# Altium footprint library CubeSat-Backplane.PcbLib: 54 footprints (part 4 of 4)
Each footprint in its own frame and in the unit in brackets; x right, y up, seen from the top. Pads: shape width x height; smd on the part's side, far side on the other; paste and mask are expansions set on the pad; w line width, h text height; cw(c..) or ccw(c..) is an arc to the next point about the centre after c.
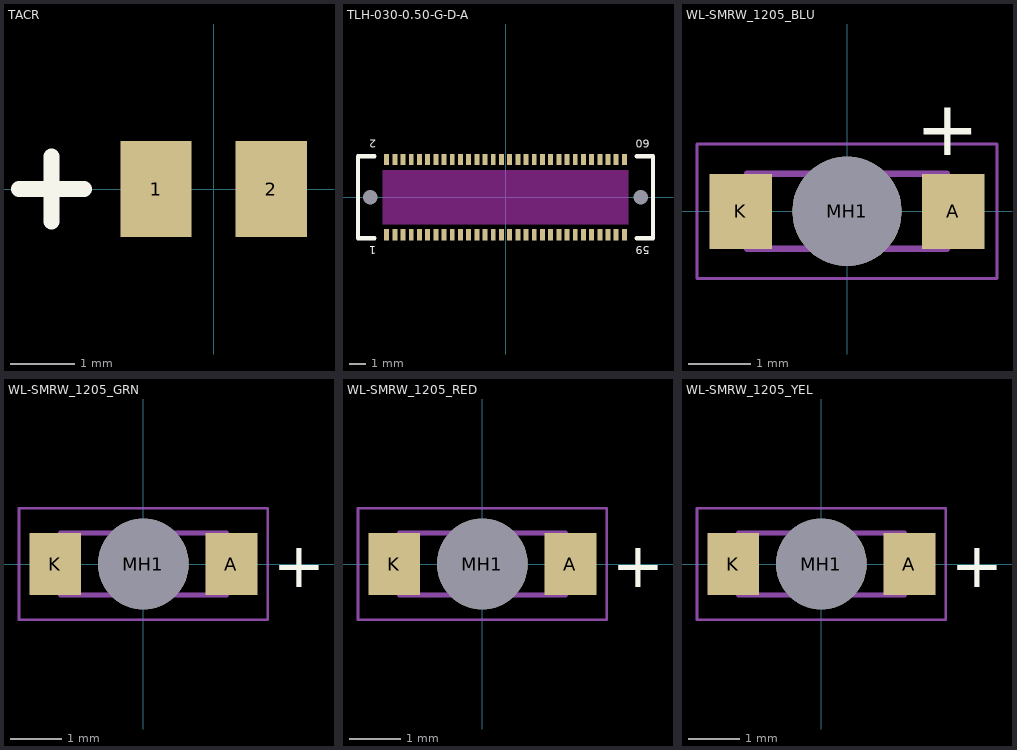
[diagram p3: the footprints below, top view; thin cyan lines are the x and y axes]

## TACR [mil]
pads (2):
  rect 44x59 smd paste+0 mask+0: 1(-35.5,0) 2(35.5,0)
Top Overlay:
  lines w10: -120,0 -80,0 ; -100,-20 -100,20
Bottom Courtyard:
  text "+ A C" at -99.98,-15 h30
3D body "TACR.step": height 59.02, standoff 0, extent -43.5,-29.48 43.51,29.49
3D body: height 10, standoff 0, extent 0,0 10,10

## TLH-030-0.50-G-D-A [mm] "Board to Board & Mezzanine Connectors 0.50 mm Razor Beam LP Ultra Low Profile Terminal Strip"
height 2
pads (62):
  rect 0.3x0.7 smd: 1(-7.25,-2.3) 2(-7.25,2.3) 3(-6.75,-2.3) 4(-6.75,2.3) 5(-6.25,-2.3) 6(-6.25,2.3) 7(-5.75,-2.3) 8(-5.75,2.3) 9(-5.25,-2.3) 10(-5.25,2.3) 11(-4.75,-2.3) 12(-4.75,2.3) 13(-4.25,-2.3) 14(-4.25,2.3) 15(-3.75,-2.3) 16(-3.75,2.3) 17(-3.25,-2.3) 18(-3.25,2.3) 19(-2.75,-2.3) 20(-2.75,2.3) 21(-2.25,-2.3) 22(-2.25,2.3) 23(-1.75,-2.3) 24(-1.75,2.3) 25(-1.25,-2.3) 26(-1.25,2.3) 27(-0.75,-2.3) 28(-0.75,2.3) 29(-0.25,-2.3) 30(-0.25,2.3) 31(0.25,-2.3) 32(0.25,2.3) 33(0.75,-2.3) 34(0.75,2.3) 35(1.25,-2.3) 36(1.25,2.3) 37(1.75,-2.3) 38(1.75,2.3) 39(2.25,-2.3) 40(2.25,2.3) 41(2.75,-2.3) 42(2.75,2.3) 43(3.25,-2.3) 44(3.25,2.3) 45(3.75,-2.3) 46(3.75,2.3) 47(4.25,-2.3) 48(4.25,2.3) 49(4.75,-2.3) 50(4.75,2.3) 51(5.25,-2.3) 52(5.25,2.3) 53(5.75,-2.3) 54(5.75,2.3) 55(6.25,-2.3) 56(6.25,2.3) 57(6.75,-2.3) 58(6.75,2.3) 59(7.25,-2.3) 60(7.25,2.3)
  round 0 hole 0.9 unplated: TH(-8.25,0) TH(8.25,0)
Top Layer keep-out:
  rectangle: -7.5,-1.651 7.5,1.651
Top Overlay:
  lines w0.254: -8,-2.5 -9,-2.5 -9,2.5 -8,2.5 ; 8,-2.5 9,-2.5 9,2.5 8,2.5
  text "1" at -7.9,-3 h0.5
  text "2" at -7.9,3.5 h0.5
  text "59" at 8.8,-3 h0.5
  text "60" at 8.8,3.5 h0.5
3D body "TLH-030-0.50-G-D-A.stp": height 1.82, standoff -0.54, extent -9,-2.5 9,2.5

## WL-SMRW_1205_BLU [mm] "SMD BLU Reverse mount Waterclear, body 3.2x1.2mm"
height 0.28
pads (3):
  rect 1x1.2 smd mask+0.08: A(1.7,0) K(-1.7,0)
  round 1.75 hole 1.75 unplated mask+0: MH1(0,0)
Top Overlay:
  text "+" at 1.1,0.9 h0.89
BOARD CHAMFER:
  region: 0.35,0.65 0.35,-0.65 0.05,-0.65 0.05,-0.15 -0.25,-0.15 -0.25,0.15 0.05,0.15 0.05,0.65
  lines w0.1: -1.6,-0.6 1.6,-0.6 1.6,0.6 -1.6,0.6 -1.6,-0.6
Mechanical 15:
  lines w0.05: -0.5,0 0.5,0 ; 0,-0.5 0,0.5 ; -2.4,-1.075 2.4,-1.075 2.4,1.075 -2.4,1.075 -2.4,-1.075
3D body "WE-SMRW_1205_rectangular.stp": height 0.28, standoff -0.82, extent -1.6,-0.6 1.6,0.6

## WL-SMRW_1205_GRN [mm] "SMD GRN Reverse mount Waterclear, body 3.2x1.2mm"
height 0.28
pads (3):
  rect 1x1.2 smd: A(1.7,0) K(-1.7,0)
  round 1.75 hole 1.75 unplated: MH1(0,0)
Top Overlay:
  text "+" at 2.5,-0.45 h0.89
BOARD CHAMFER:
  region: 0.35,0.65 0.35,-0.65 0.05,-0.65 0.05,-0.15 -0.25,-0.15 -0.25,0.15 0.05,0.15 0.05,0.65
  lines w0.1: -1.6,-0.6 1.6,-0.6 1.6,0.6 -1.6,0.6 -1.6,-0.6
Mechanical 15:
  lines w0.05: -0.5,0 0.5,0 ; 0,-0.5 0,0.5 ; -2.4,-1.075 2.4,-1.075 2.4,1.075 -2.4,1.075 -2.4,-1.075
3D body "WE-SMRW_1205_rectangular.stp": height 0.28, standoff -0.82, extent -1.6,-0.6 1.6,0.6

## WL-SMRW_1205_RED [mm] "SMD GRN Reverse mount Waterclear, body 3.2x1.2mm"
height 0.28
pads (3):
  rect 1x1.2 smd: A(1.7,0) K(-1.7,0)
  round 1.75 hole 1.75 unplated: MH1(0,0)
Top Overlay:
  text "+" at 2.5,-0.45 h0.89
BOARD CHAMFER:
  region: 0.35,0.65 0.35,-0.65 0.05,-0.65 0.05,-0.15 -0.25,-0.15 -0.25,0.15 0.05,0.15 0.05,0.65
  lines w0.1: -1.6,-0.6 1.6,-0.6 1.6,0.6 -1.6,0.6 -1.6,-0.6
Mechanical 15:
  lines w0.05: -0.5,0 0.5,0 ; 0,-0.5 0,0.5 ; -2.4,-1.075 2.4,-1.075 2.4,1.075 -2.4,1.075 -2.4,-1.075
3D body "WE-SMRW_1205_rectangular.stp": height 0.28, standoff -0.82, extent -1.6,-0.6 1.6,0.6

## WL-SMRW_1205_YEL [mm] "SMD GRN Reverse mount Waterclear, body 3.2x1.2mm"
height 0.28
pads (3):
  rect 1x1.2 smd: A(1.7,0) K(-1.7,0)
  round 1.75 hole 1.75 unplated: MH1(0,0)
Top Overlay:
  text "+" at 2.5,-0.45 h0.89
BOARD CHAMFER:
  region: 0.35,0.65 0.35,-0.65 0.05,-0.65 0.05,-0.15 -0.25,-0.15 -0.25,0.15 0.05,0.15 0.05,0.65
  lines w0.1: -1.6,-0.6 -1.6,0.6 1.6,0.6 1.6,-0.6 -1.6,-0.6
Mechanical 15:
  lines w0.05: -0.5,0 0.5,0 ; 0,-0.5 0,0.5 ; -2.4,-1.075 -2.4,1.075 2.4,1.075 2.4,-1.075 -2.4,-1.075
3D body "WE-SMRW_1205_rectangular.stp": height 0.28, standoff -0.82, extent -1.6,-0.6 1.6,0.6